# Altium footprint library DD2088PoE_Daisy_Chain.PcbLib: 62 footprints (part 3 of 4)
Each footprint in its own frame and in the unit in brackets; x right, y up, seen from the top. Pads: shape width x height; smd on the part's side, far side on the other; paste and mask are expansions set on the pad; w line width, h text height; cw(c..) or ccw(c..) is an arc to the next point about the centre after c.
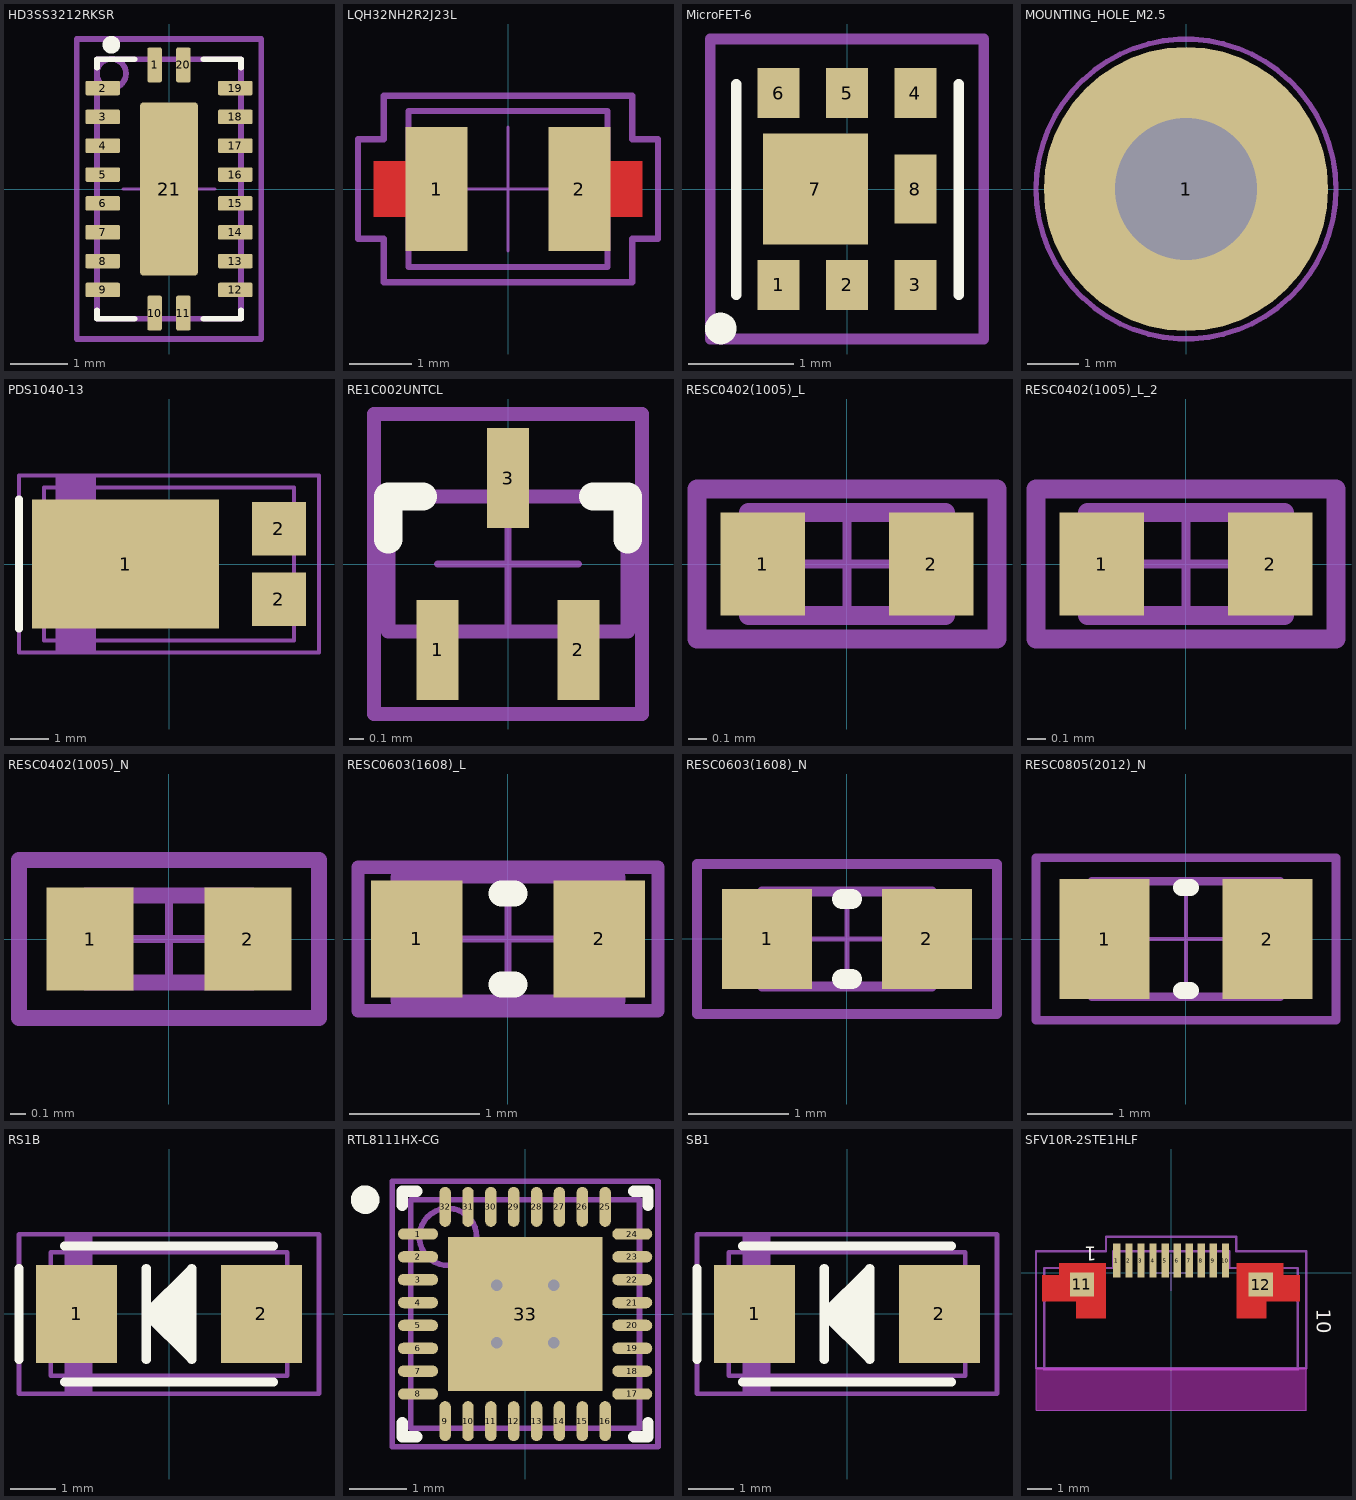
[diagram p2: the footprints below, top view; thin cyan lines are the x and y axes]

## HD3SS3212RKSR [mm] "VQFN-20"
height 1
pads (21):
  rrect20% 0.25x0.6 smd mask+0.07: 1(-0.25,2.15) 10(-0.25,-2.15) 11(0.25,-2.15) 20(0.25,2.15)
  rrect20% 0.6x0.25 smd mask+0.07: 2(-1.15,1.75) 3(-1.15,1.25) 4(-1.15,0.75) 5(-1.15,0.25) 6(-1.15,-0.25) 7(-1.15,-0.75) 8(-1.15,-1.25) 9(-1.15,-1.75) 12(1.15,-1.75) 13(1.15,-1.25) 14(1.15,-0.75) 15(1.15,-0.25) 16(1.15,0.25) 17(1.15,0.75) 18(1.15,1.25) 19(1.15,1.75)
  rrect10% 1x3 smd paste-3 mask+0.07: 21(0,0)
Top Overlay:
  circle w0.254: c-1,2.5 r0.025
  lines w0.1: -1.25,-2.1 -1.25,-2.25 -0.6,-2.25 ; -1.25,2.1 -1.25,2.25 -0.6,2.25 ; 0.6,-2.25 1.25,-2.25 1.25,-2.1 ; 0.6,2.25 1.25,2.25 1.25,2.1
Top Paste:
  region: -0.5,1.3 -0.5,1.32 -0.485,1.357 -0.457,1.385 -0.42,1.4 -0.4,1.4 0.4,1.4 0.42,1.4 0.457,1.385 0.485,1.357 0.5,1.32 0.5,1.3 0.5,0.2 0.5,0.18 0.485,0.143 0.457,0.115 0.42,0.1 0.4,0.1 -0.4,0.1 -0.42,0.1 -0.457,0.115 -0.485,0.143 -0.5,0.18 -0.5,0.2
  region: 0.5,-1.3 0.5,-1.32 0.485,-1.357 0.457,-1.385 0.42,-1.4 0.4,-1.4 -0.4,-1.4 -0.42,-1.4 -0.457,-1.385 -0.485,-1.357 -0.5,-1.32 -0.5,-1.3 -0.5,-0.2 -0.5,-0.18 -0.485,-0.143 -0.457,-0.115 -0.42,-0.1 -0.4,-0.1 0.4,-0.1 0.42,-0.1 0.457,-0.115 0.485,-0.143 0.5,-0.18 0.5,-0.2
Top Assembly:
  circle w0.102: c-1,2.003 r0.254
  lines w0.1: -1.6,-2.6 -1.6,2.6 1.6,2.6 1.6,-2.6 -1.6,-2.6
  text "'.Designator'" at 0.675,0.523 h1
Mechanical 7:
  text "Based on 0.125 thick stencil" at 0.105,-2.6 h0.5
Top Courtyard:
  lines w0.05: -0.8,0 0,0 ; 0,-0.8 0,0 ; 0,0.8 0,0 ; 0.8,0 0,0 ; -1.6,-2.6 -1.6,2.6 1.6,2.6 1.6,-2.6 -1.6,-2.6
Top Component Outline:
  lines w0.1: -1.25,-2.25 -1.25,2.25 1.25,2.25 1.25,-2.25 -1.25,-2.25
3D body: height 1, standoff 0, extent -1.25,-2.25 1.25,2.25

## LQH32NH2R2J23L [mm] "inductor 3.20mm x 2.50mm x 2.2mm"
height 2.2
pads (2):
  rect 1x2 smd: 1(-1.15,0) 2(1.15,0)
Top Layer:
  region: 1.15,0.45 2.159,0.45 2.159,-0.45 1.15,-0.45
  region: -1.15,-0.45 -2.159,-0.45 -2.159,0.45 -1.15,0.45
Top Assembly:
  lines w0.1: -2.413,-0.8 -2,-0.8 -2,-1.5 2,-1.5 2,-0.8 2.413,-0.8 2.413,0.8 2,0.8 2,1.5 -2,1.5 -2,0.8 -2.413,0.8 -2.413,-0.8
  text "'.Designator'" at 0.8,0.488 h1
Top Courtyard:
  lines w0.05: -1,0 0,0 ; 0,-1 0,0 ; 0,1 0,0 ; 1,0 0,0 ; -2.413,-0.8 -2,-0.8 -2,-1.5 2,-1.5 2,-0.8 2.413,-0.8 2.413,0.8 2,0.8 2,1.5 -2,1.5 -2,0.8 -2.413,0.8 -2.413,-0.8
Top Component Outline:
  lines w0.1: -1.6,-1.254 -1.6,1.254 1.6,1.254 1.6,-1.254 -1.6,-1.254
3D body "LQH32PN_N0.stp": height 1.55, standoff 0, extent -1.6,-1.254 1.6,1.254

## MicroFET-6 [mm]
pads (8):
  rect 0.4x0.475 smd mask+0.03: 1(-0.65,-0.912) 2(0,-0.912) 3(0.65,-0.912) 4(0.65,0.912) 5(0,0.912) 6(-0.65,0.912)
  rect 1x1.05 smd mask+0.03: 7(-0.3,0)
  rect 0.4x0.66 smd mask+0.03: 8(0.65,0)
Top Overlay:
  circle w0.2: c-1.2,-1.325 r0.05
  lines w0.1: -1.053,-1.003 -1.053,0.997 ; 1.062,-1.004 1.062,0.996
Top Assembly:
  text ".Designator" at -0.508,0 h0.5
Top Courtyard:
  lines w0.1: -1.3,-1.425 -1.3,1.425 1.3,1.425 1.3,-1.425 -1.3,-1.425
3D body "User Library-MicroFET-6(2_0).STEP": height 0.8, standoff 0, extent -1,-1 1,1

## MOUNTING_HOLE_M2.5 [mm] "2.7mm dia hole, 5.5mm dia ring"
height 17
pads (1):
  round 5.5 / inner round 3 / far side round 5.5 hole 2.75: 1(0,0)
Top Assembly:
  circle w0.1: c0,0 r2.9
  text "'.Designator'" at 0.776,0.4 h1
Bottom Assembly:
  circle w0.1: c0,0 r2.9
  text "'.Designator'" at -0.769,0.324 h1
Top Courtyard:
  circle w0.05: c0,0 r2.9
Bottom Courtyard:
  circle w0.05: c0,0 r2.9

## PDS1040-13 [mm] "Powerdi5 Diodes"
height 1.15
pads (3):
  rect 4.86x3.36 smd: 1(-1.126,0)
  rect 1.4x1.39 smd: 2(2.856,-0.92) 2(2.856,0.92)
Top Overlay:
  lines w0.2: -3.9,-1.68 -3.9,1.68
Top Assembly:
  region: -1.91,-2.296 -1.91,2.304 -2.939,2.304 -2.939,-2.296
  lines w0.1: -3.9,-2.3 3.9,-2.3 3.9,2.3 -3.9,2.3 -3.9,-2.3
  text "'.Designator'" at 0.511,0.15 h1
Top Courtyard:
  lines w0.05: -0.5,0 0.5,0 ; 0,-0.5 0,0.5 ; -3.9,-2.3 -3.9,2.3 3.9,2.3 3.9,-2.3 -3.9,-2.3
Top Component Outline:
  lines w0.1: -3.254,1.985 3.254,1.985 3.254,-1.985 -3.254,-1.985 -3.254,1.985 ; -3.254,1.985 -3.254,1.985
3D body "PowerDI5.stp": height 1.12, standoff 0.02, extent -3.254,-1.985 3.254,1.985

## RE1C002UNTCL [mm] "ROHM SOT-416FL"
height 0.85
pads (3):
  rect 0.3x0.71 smd: 1(-0.5,-0.61) 2(0.5,-0.61) 3(0,0.61)
Top Overlay:
  lines w0.2: -0.85,0.175 -0.85,0.48 -0.605,0.48 ; 0.605,0.48 0.85,0.48 0.85,0.175
Top Assembly:
  lines w0.1: -0.95,-1.065 0.95,-1.065 0.95,1.065 -0.95,1.065 -0.95,-1.065
  text "'.Designator'" at -0.325,0.51 h1
Top Courtyard:
  lines w0.05: -0.5,0 0.5,0 ; 0,-0.5 0,0.5 ; -0.95,-1.065 -0.95,1.065 0.95,1.065 0.95,-1.065 -0.95,-1.065
Top Component Outline:
  lines w0.1: -0.85,-0.48 0.85,-0.48 0.85,0.48 -0.85,0.48 -0.85,-0.48
3D body "Trans_ROHM_RE1C002UNTCL_eec.STEP": height 0.75, standoff 0, extent -0.8,-0.8 0.8,0.8

## RESC0402(1005)_L [mm] "Chip Resistor, Body 1.0x0.5mm, IPC High Density"
height 0.4
pads (2):
  rect 0.45x0.55 smd: 1(-0.45,0) 2(0.45,0)
Top Assembly:
  lines w0.1: -0.8,-0.4 -0.8,0.4 0.8,0.4 0.8,-0.4 -0.8,-0.4
  text "'.Designator'" at 0,0 h1
Top Courtyard:
  lines w0.05: -0.275,0 0.275,0 ; 0,-0.275 0,0.275 ; -0.8,-0.4 -0.8,0.4 0.8,0.4 0.8,-0.4 -0.8,-0.4
Top Component Outline:
  lines w0.1: -0.525,-0.275 0.525,-0.275 0.525,0.275 -0.525,0.275 -0.525,-0.275
3D body: height 0.4, standoff 0, extent 0.3,-0.275 0.525,0.275
3D body: height 0.4, standoff 0, extent -0.3,-0.275 0.3,0.275
3D body: height 0.4, standoff 0, extent -0.525,-0.275 -0.3,0.275

## RESC0402(1005)_L_2 [mm]
pads (2):
  rect 0.45x0.55 smd: 1(-0.45,0) 2(0.45,0)
Top Assembly:
  lines w0.1: -0.8,-0.4 0.8,-0.4 0.8,0.4 -0.8,0.4 -0.8,-0.4
  text "'.Designator'" at 0.788,0.272 h1
Top Courtyard:
  lines w0.05: -0.275,0 0.275,0 ; 0,-0.275 0,0.275 ; -0.8,-0.4 0.8,-0.4 0.8,0.4 -0.8,0.4 -0.8,-0.4
Top Component Outline:
  lines w0.1: -0.525,-0.275 -0.525,0.275 0.525,0.275 0.525,-0.275 -0.525,-0.275
3D body: height 0.4, standoff 0, extent -0.525,-0.275 -0.3,0.275
3D body: height 0.4, standoff 0, extent -0.3,-0.275 0.3,0.275
3D body: height 0.4, standoff 0, extent 0.3,-0.275 0.525,0.275

## RESC0402(1005)_N [mm] "Chip Resistor, Body 1.0x0.5mm, IPC Medium Density"
height 0.4
pads (2):
  rect 0.55x0.65 smd: 1(-0.5,0) 2(0.5,0)
Top Assembly:
  lines w0.1: -0.95,-0.5 0.95,-0.5 0.95,0.5 -0.95,0.5 -0.95,-0.5
  text "'.Designator'" at -0.8,-0.3 h1
Top Courtyard:
  lines w0.05: -0.275,0 0.275,0 ; 0,-0.275 0,0.275 ; -0.95,-0.5 0.95,-0.5 0.95,0.5 -0.95,0.5 -0.95,-0.5
Top Component Outline:
  lines w0.1: -0.525,-0.275 -0.525,0.275 0.525,0.275 0.525,-0.275 -0.525,-0.275
3D body: height 0.4, standoff 0, extent 0.3,-0.275 0.525,0.275
3D body: height 0.4, standoff 0, extent -0.3,-0.275 0.3,0.275
3D body: height 0.4, standoff 0, extent -0.525,-0.275 -0.3,0.275

## RESC0603(1608)_L [mm] "Chip Resistor, Body 1.6x0.8mm, IPC High Density"
height 0.6
pads (2):
  rect 0.7x0.9 smd: 1(-0.7,0) 2(0.7,0)
Top Overlay:
  lines w0.2: -0.05,-0.35 0.05,-0.35 ; -0.05,0.35 0.05,0.35
Top Assembly:
  lines w0.1: -1.15,-0.55 -1.15,0.55 1.15,0.55 1.15,-0.55 -1.15,-0.55
  text "'.Designator'" at -0.775,-0.25 h1
Top Courtyard:
  lines w0.05: -0.475,0 0.475,0 ; 0,-0.475 0,0.475 ; -1.15,-0.55 1.15,-0.55 1.15,0.55 -1.15,0.55 -1.15,-0.55
Top Component Outline:
  lines w0.1: -0.85,-0.475 0.85,-0.475 0.85,0.475 -0.85,0.475 -0.85,-0.475
3D body: height 0.6, standoff 0, extent 0.581,-0.474 0.85,0.475
3D body: height 0.6, standoff 0, extent -0.58,-0.474 0.581,0.475
3D body: height 0.6, standoff 0, extent -0.849,-0.474 -0.58,0.475

## RESC0603(1608)_N [mm] "Chip Resistor, Body 1.6x0.8mm, IPC Medium Density"
height 0.6
pads (2):
  rect 0.9x1 smd: 1(-0.8,0) 2(0.8,0)
Top Overlay:
  lines w0.2: -0.05,-0.4 0.05,-0.4 ; -0.05,0.4 0.05,0.4
Top Assembly:
  lines w0.1: -1.5,-0.75 -1.5,0.75 1.5,0.75 1.5,-0.75 -1.5,-0.75
  text "'.Designator'" at 0.532,0.257 h1
Top Courtyard:
  lines w0.05: -0.475,0 0.475,0 ; 0,-0.475 0,0.475 ; -1.5,-0.75 -1.5,0.75 1.5,0.75 1.5,-0.75 -1.5,-0.75
Top Component Outline:
  lines w0.1: -0.85,-0.475 0.85,-0.475 0.85,0.475 -0.85,0.475 -0.85,-0.475
3D body: height 0.6, standoff 0, extent -0.849,-0.474 -0.58,0.475
3D body: height 0.6, standoff 0, extent -0.58,-0.474 0.581,0.475
3D body: height 0.6, standoff 0, extent 0.581,-0.474 0.85,0.475

## RESC0805(2012)_N [mm] "Chip Resistor, Body 2.0x1.3mm, IPC Medium Density"
height 0.7
pads (2):
  rect 1.05x1.4 smd: 1(-0.95,0) 2(0.95,0)
Top Overlay:
  lines w0.2: -0.05,-0.6 0.05,-0.6 ; -0.05,0.6 0.05,0.6
Top Assembly:
  lines w0.1: -1.75,-0.95 1.75,-0.95 1.75,0.95 -1.75,0.95 -1.75,-0.95
  text "'.Designator'" at 0.5,0.4 h1
Top Courtyard:
  lines w0.05: -0.5,0 0.5,0 ; 0,-0.5 0,0.5 ; -1.75,-0.95 -1.75,0.95 1.75,0.95 1.75,-0.95 -1.75,-0.95
Top Component Outline:
  lines w0.1: -1.1,-0.675 -1.1,0.675 1.1,0.675 1.1,-0.675 -1.1,-0.675
3D body: height 0.7, standoff 0, extent -1.1,-0.675 -0.68,0.675
3D body: height 0.7, standoff 0, extent -0.68,-0.675 0.68,0.675
3D body: height 0.7, standoff 0, extent 0.68,-0.675 1.1,0.675

## RS1B [mil] "Molded Diode, 2-Leads, Body 4.30x2.59mm, IPC Medium Density"
height 106.3
pads (2):
  rect 70x85 smd: 1(-80,0) 2(80,0)
Top Overlay:
  pour cut-out: -19.69,39.37 -19.69,0
  region: 19.69,-39.37 19.69,39.37 -19.68,0
  lines w3.94: -19.68,0 0,-19.68
  lines w7.87: -129.92,-39.37 -129.92,39.37 ; -90.55,-59.06 90.55,-59.06 ; -90.55,59.06 90.55,59.06 ; -19.68,-39.37 -19.68,39.37 ; -19.68,0 19.69,39.37 19.69,-39.37 -19.68,0
Top Assembly:
  region: -66.19,68.9 -90.55,68.9 -90.55,-68.9 -66.19,-68.9
  lines w3.94: -129.92,-68.9 -129.92,68.9 129.92,68.9 129.92,-68.9 -129.92,-68.9
  text "'.Designator'" at -5.91,-1.89 h39.37
Top Courtyard:
  lines w1.97: -19.68,0 19.69,0 ; 0,-19.68 0,19.69 ; -129.92,-68.9 129.92,-68.9 129.92,68.9 -129.92,68.9 -129.92,-68.9
Top Component Outline:
  lines w3.94: -102.36,-53.64 102.36,-53.64 102.36,53.64 -102.36,53.64 -102.36,-53.64
3D body "S1G--3DModel-STEP-56544.STEP": height 106.3, standoff 0, extent -102.36,-53.64 102.36,53.64

## RTL8111HX-CG [mm] "QFN, 32-Leads, Body 4.00x4.00mm, Pitch 0.40mm, Thermal Pad 2.70x2.70mm, IPC High Density"
height 0.9
pads (33):
  oval 0.7x0.2 smd mask+0.076: 1(-1.875,1.4) 2(-1.875,1) 3(-1.875,0.6) 4(-1.875,0.2) 5(-1.875,-0.2) 6(-1.875,-0.6) 7(-1.875,-1) 8(-1.875,-1.4) 17(1.875,-1.4) 18(1.875,-1) 19(1.875,-0.6) 20(1.875,-0.2) 21(1.875,0.2) 22(1.875,0.6) 23(1.875,1) 24(1.875,1.4)
  oval 0.2x0.7 smd mask+0.076: 9(-1.4,-1.875) 10(-1,-1.875) 11(-0.6,-1.875) 12(-0.2,-1.875) 13(0.2,-1.875) 14(0.6,-1.875) 15(1,-1.875) 16(1.4,-1.875) 25(1.4,1.875) 26(1,1.875) 27(0.6,1.875) 28(0.2,1.875) 29(-0.2,1.875) 30(-0.6,1.875) 31(-1,1.875) 32(-1.4,1.875)
  rect 2.7x2.7 smd paste-2 mask+0.076: 33(0,0)
via 0.5,-0.5 diameter 0.406 hole 0.203
via -0.5,-0.5 diameter 0.406 hole 0.203
via 0.5,0.5 diameter 0.406 hole 0.203
via -0.5,0.5 diameter 0.406 hole 0.203
Top Overlay:
  circle w0.25: c-2.8,2 r0.125
  lines w0.2: -2.15,-1.9 -2.15,-2.15 -1.9,-2.15 ; -2.15,1.9 -2.15,2.15 -1.9,2.15 ; 1.9,-2.15 2.15,-2.15 2.15,-1.9 ; 1.9,2.15 2.15,2.15 2.15,1.9
Top Paste:
  region: -0.7,-1.3 -1.3,-1.3 -1.3,-0.7 -0.7,-0.7
  region: -1.3,0.7 -1.3,1.3 -0.7,1.3 -0.7,0.7
  region: 0.7,1.3 1.3,1.3 1.3,0.7 0.7,0.7
  region: 1.3,-0.7 1.3,-1.3 0.7,-1.3 0.7,-0.7
  region: 0.3,-0.7 0.3,-1.3 -0.3,-1.3 -0.3,-0.7
  region: -0.7,-0.3 -1.3,-0.3 -1.3,0.3 -0.7,0.3
  region: -0.3,0.7 -0.3,1.3 0.3,1.3 0.3,0.7
  region: 0.7,0.3 1.3,0.3 1.3,-0.3 0.7,-0.3
  region: -0.3,0.3 0.3,0.3 0.3,-0.3 -0.3,-0.3
Top Assembly:
  circle w0.1: c-1.35,1.35 r0.5
  lines w0.1: -2.325,-2.325 2.325,-2.325 2.325,2.325 -2.325,2.325 -2.325,-2.325
  text "'.Designator'" at 0.776,0.4 h1
Top Courtyard:
  lines w0.05: -0.5,0 0.5,0 ; 0,-0.5 0,0.5 ; -2.325,-2.325 2.325,-2.325 2.325,2.325 -2.325,2.325 -2.325,-2.325
Top Component Outline:
  lines w0.1: -2.001,-2.001 2.001,-2.001 2.001,2.001 -2.001,2.001 -2.001,-2.001
3D body "QFN40P400X400X90_HS-33N.step": height 0.9, standoff 0, extent -2.001,-2.001 2.001,2.001

## SB1 [mil] "Molded Diode, 2-Leads, Body 4.30x2.59mm, IPC Medium Density"
height 106.3
pads (2):
  rect 70x85 smd: 1(-80,0) 2(80,0)
Top Overlay:
  pour cut-out: -19.69,39.37 -19.69,0
  region: 19.69,-39.37 19.69,39.37 -19.68,0
  lines w3.94: -19.68,0 0,-19.68
  lines w7.87: -129.92,-39.37 -129.92,39.37 ; -90.55,-59.06 90.55,-59.06 ; -90.55,59.06 90.55,59.06 ; -19.68,-39.37 -19.68,39.37 ; -19.68,0 19.69,39.37 19.69,-39.37 -19.68,0
Top Assembly:
  region: -66.19,68.9 -90.55,68.9 -90.55,-68.9 -66.19,-68.9
  lines w3.94: -129.92,-68.9 -129.92,68.9 129.92,68.9 129.92,-68.9 -129.92,-68.9
  text "'.Designator'" at -0.98,33.46 h39.37
Top Courtyard:
  lines w1.97: -19.68,0 19.69,0 ; 0,-19.68 0,19.69 ; -129.92,-68.9 129.92,-68.9 129.92,68.9 -129.92,68.9 -129.92,-68.9
Top Component Outline:
  lines w3.94: -102.36,-53.64 102.36,-53.64 102.36,53.64 -102.36,53.64 -102.36,-53.64
3D body "S1G--3DModel-STEP-56544.STEP": height 106.3, standoff 0, extent -102.36,-53.64 102.36,53.64

## SFV10R-2STE1HLF [mm] "CONN FFC TOP 10POS 0.50MM R/A"
height 2
pads (13):
  rect 0.305x1.405 smd: 1(-2.258,0.494) 1(-2.258,0.494) 2(-1.759,0.494) 3(-1.258,0.494) 4(-0.758,0.494) 5(-0.258,0.494) 6(0.242,0.494) 7(0.741,0.494) 8(1.242,0.494) 9(1.742,0.494) 10(2.242,0.494)
  rect 1x1 smd: 11(-3.707,-0.486) 12(3.708,-0.494)
Top Layer:
  region: 3.942,0.394 2.692,0.394 2.692,-1.906 3.942,-1.906
  region: 5.341,-0.105 2.691,-0.105 2.691,-1.205 5.341,-1.205
  region: 4.641,0.395 2.691,0.395 2.691,-1.205 4.641,-1.205
  rectangle: -4.658,-1.205 -2.708,0.395
  rectangle: -5.358,-1.205 -2.708,-0.105
  rectangle: -3.958,-1.906 -2.708,0.394
Top Overlay:
  text "10" at 5.825,-1.5 h1
  text "1" at -3.1,1.275 h1
Top Paste:
  region: 5.341,-0.105 2.691,-0.105 2.691,-1.205 5.341,-1.205
  region: 4.641,0.395 2.691,0.395 2.691,-1.205 4.641,-1.205
  region: 3.942,0.394 2.692,0.394 2.692,-1.906 3.942,-1.906
  rectangle: -5.358,-1.205 -2.708,-0.105
  rectangle: -4.658,-1.205 -2.708,0.395
  rectangle: -3.958,-1.906 -2.708,0.394
Keep-Out Layer:
  region: 5.594,-5.708 5.594,-3.973 -5.611,-3.973 -5.611,-5.708
Top Assembly:
  lines w0.1: -5.611,-3.973 -5.611,0.892 -2.711,0.892 -2.711,1.492 2.694,1.492 2.694,0.892 5.594,0.892 5.594,-3.973 -5.611,-3.973
  text "'.Designator'" at 0.824,0.275 h1
Mechanical 7:
  text "Top contact ffc" at -2.756,-3.708 h1
Top Courtyard:
  lines w0.05: -0.75,0 0,0 ; 0,-0.75 0,0 ; 0,0.75 0,0 ; 0.75,0 0,0 ; -5.611,-5.708 -5.611,0.892 -5.261,0.892 -2.711,0.892 -2.711,1.492 2.694,1.492 2.694,0.892 5.244,0.892 5.594,0.892 5.594,-5.708 -5.611,-5.708
Top Component Outline:
  lines w0.1: 5.239,0.192 5.239,-4.008 -5.261,-4.008 -5.261,0.192 -2.411,0.192 -2.411,0.892 2.394,0.892 2.394,0.192 5.244,0.192
3D body "ssfv10r_2stlf.stp": height 1.82, standoff -0.05, extent -5.261,-4.008 5.239,0.892